# Altium footprint library Altium_Lib.PcbLib: 334 footprints (part 15 of 21)
Each footprint in its own frame and in the unit in brackets; x right, y up, seen from the top. Pads: shape width x height; smd on the part's side, far side on the other; paste and mask are expansions set on the pad; w line width, h text height; cw(c..) or ccw(c..) is an arc to the next point about the centre after c.
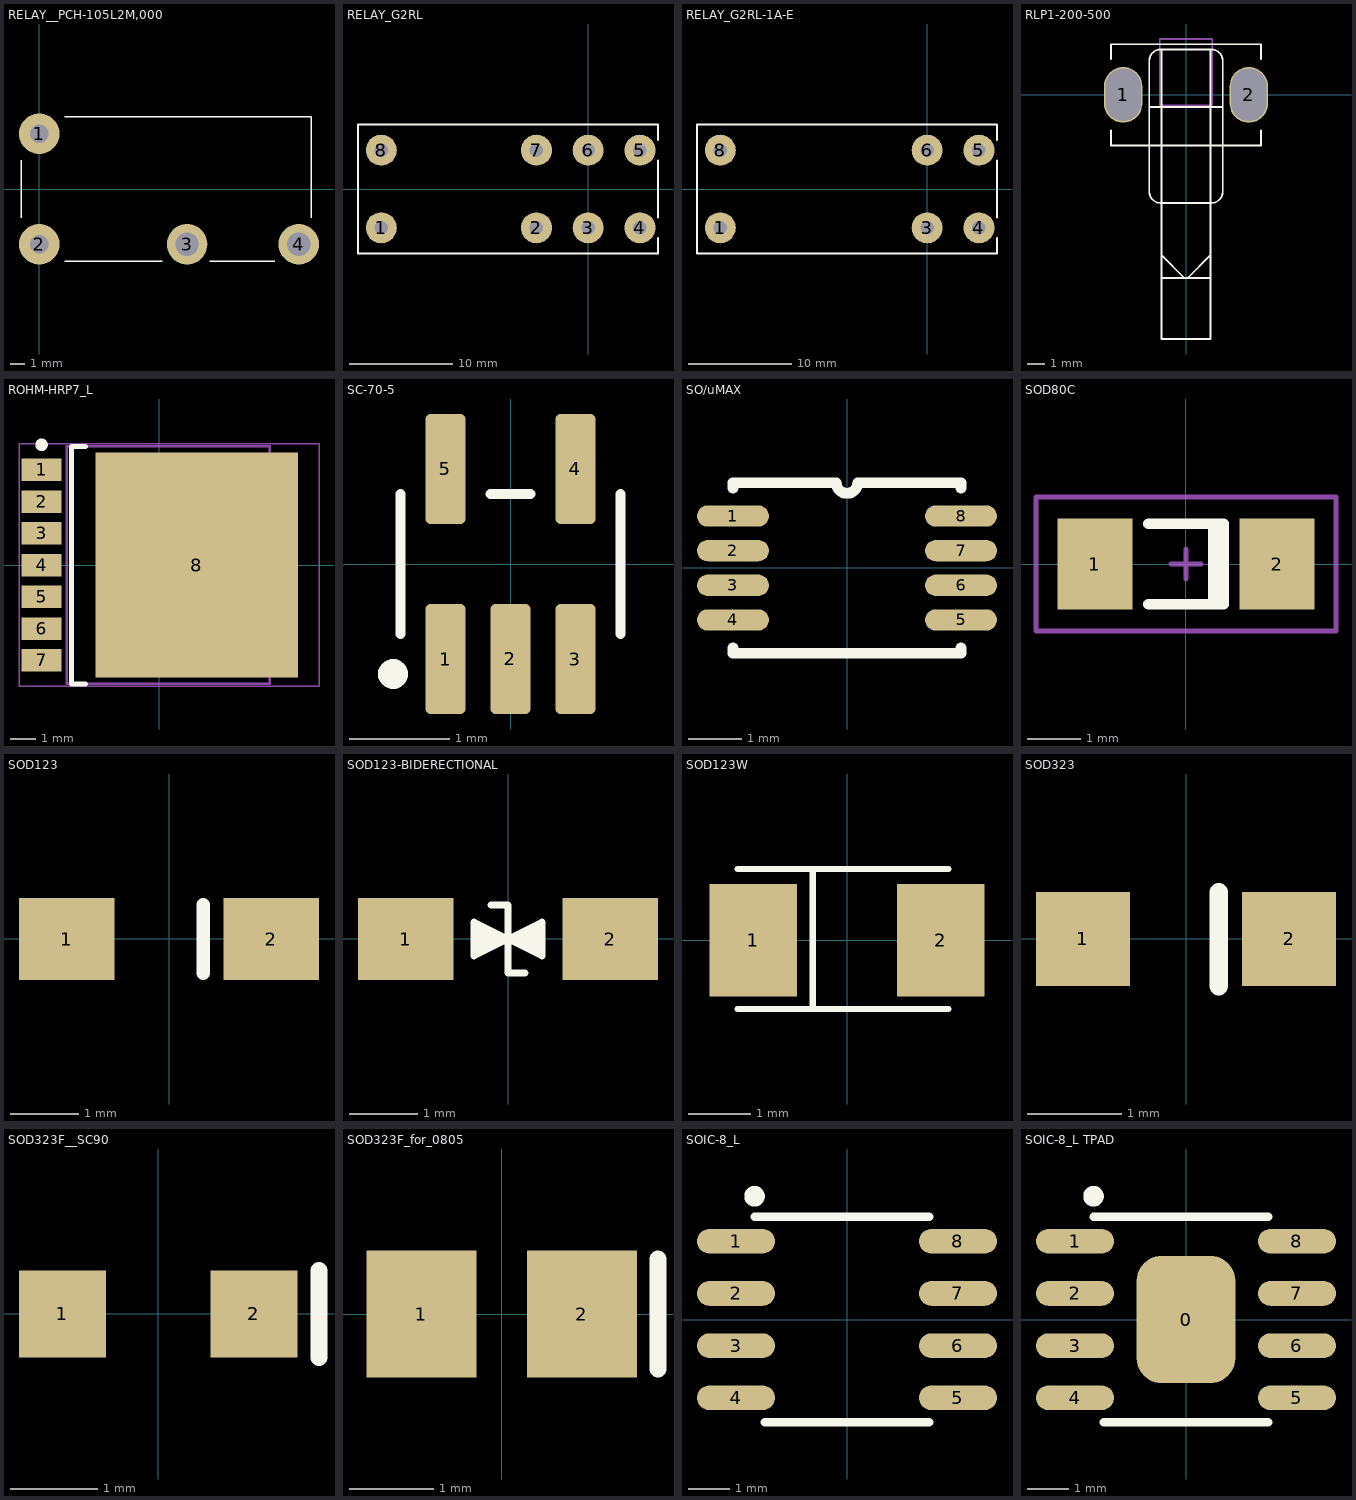
[diagram p14: the footprints below, top view; thin cyan lines are the x and y axes]

## RELAY__PCH-105L2M,000 [mm]
pads (4):
  round 2.8 hole 1.3: 1(0,3.81) 2(0,-3.81)
  round 2.8 hole 1.6: 3(10.2,-3.81) 4(17.9,-3.81)
Top Overlay:
  lines w0.1: -1.25,-2 -1.25,2 ; 1.75,-5 8.5,-5 ; 1.75,5 18.75,5 18.75,-2 ; 11.75,-5 16.25,-5 ; 18.75,-2 18.75,-2
3D body "c-2-1416010-3-a-3d.stp": height 10.65, standoff -3.55, extent -1.25,-5 18.75,5

## RELAY_G2RL [mm]
pads (8):
  round 3 hole 1.3 mask+0.05: 1(-20,-3.75) 2(-5,-3.75) 3(0,-3.75) 4(5,-3.75) 5(5,3.75) 6(0,3.75) 7(-5,3.75) 8(-20,3.75)
Top Overlay:
  lines w0.2: 6.75,-4.75 6.75,-6.25 -22.25,-6.25 -22.25,6.25 6.75,6.25 6.75,4.75 ; 6.75,-2.75 6.75,2.75
3D body "g2rl-2_5dc.stp": height 15.9, standoff -3.3, extent -22.25,-6.35 6.75,6.35

## RELAY_G2RL-1A-E [mm]
pads (6):
  round 3 hole 1.3 mask+0.05: 1(-20,-3.75) 3(0,-3.75) 4(5,-3.75) 5(5,3.75) 6(0,3.75) 8(-20,3.75)
Top Overlay:
  lines w0.2: 6.75,-4.75 6.75,-6.25 -22.25,-6.25 -22.25,6.25 6.75,6.25 6.75,4.75 ; 6.75,-2.75 6.75,2.75
3D body "G2RL_1A_E.step": height 15.7, standoff -3.5, extent -22.25,-6.4 6.75,6.3

## RLP1-200-500 [mm]
pads (2):
  oval 2.2x3.2 hole 2 slot 3 at 90 deg: 1(-3.6,0) 2(3.6,0)
Top Overlay:
  lines w0.1: -4.3,-2.05 -4.3,-2.9 4.3,-2.9 4.3,-2.05 ; -4.3,2.05 -4.3,2.9 4.3,2.9 4.3,2.05 ; -2.1,-0.7 -2.1,-5.565 ccw(c-1.465,-5.565) -1.465,-6.2 1.465,-6.2 ccw(c1.465,-5.565) 2.1,-5.565 2.1,-0.7 ; -2.1,-0.7 -2.1,1.965 cw(c-1.465,1.965) -1.465,2.6 -1.4,2.6 ; -2.1,-0.7 2.1,-0.7 ; -1.4,-10.5 -1.4,-9.2 ; -1.4,-10.5 -1.4,-14 1.4,-14 1.4,-10.5 ; -1.4,-10.5 -0.1,-10.5 ; -1.4,-9.2 -1.4,2.6 ; -1.4,-9.2 -0.1,-10.5 ; -1.4,2.6 1.4,2.6 ; -0.1,-10.5 0.1,-10.5 ; 0.1,-10.5 1.4,-10.5 ; 0.1,-10.5 1.4,-9.2 ; 1.4,-10.5 1.4,-9.2 ; 1.4,-9.2 1.4,2.6 ; 1.4,2.6 1.465,2.6 cw(c1.465,1.965) 2.1,1.965 2.1,-0.7
Mechanical 16:
  lines w0.1: -1.5,-0.6 1.5,-0.6 1.5,3.2 -1.5,3.2 -1.5,-0.6
3D body "RLP1-200-500(part).STEP": height 7.38, standoff -2.71, extent -4.88,-14 4.68,2.9

## ROHM-HRP7_L [mm]
pads (8):
  rect 1.6x0.9 smd: 1(-4.7,3.81) 2(-4.7,2.54) 3(-4.7,1.27) 4(-4.7,0) 5(-4.7,-1.27) 6(-4.7,-2.54) 7(-4.7,-3.81)
  rect 8.1x9 smd: 8(1.5,0)
Top Overlay:
  circle w0.25: c-4.7,4.81 r0.125
  lines w0.2: -2.95,-4.75 -3.5,-4.75 -3.5,4.75 -2.95,4.75
Mechanical 13:
  lines w0.1: -3.7,-4.75 4.43,-4.75 4.43,4.75 -3.7,4.75 -3.7,-4.75
Mechanical 15:
  lines w0.05: -5.6,-4.85 6.397,-4.85 6.397,4.85 -5.6,4.85 -5.6,-4.85
  lines w0.1: -0.5,0 0.5,0 ; 0,-0.5 0,0.5
3D body "DPAK127P1054X201-8L.step": height 2.03, standoff 0, extent -4.193,-4.75 6.347,4.75

## SC-70-5 [mm]
height 1
pads (5):
  rrect25% 0.4x1.1 smd mask+0.051: 1(-0.65,-0.95) 2(0,-0.95) 3(0.65,-0.95) 4(0.65,0.95) 5(-0.65,0.95)
Top Overlay:
  circle w0.15: c-1.175,-1.1 r0.075
  lines w0.1: -1.1,-0.7 -1.1,0.7 ; -0.2,0.7 0.2,0.7 ; 1.1,-0.7 1.1,0.7
3D body "SC70_5.step": height 1.1, standoff 0, extent -1.1,-1.2 1.1,1.2

## SO/uMAX [mm]
height 1.75
pads (8):
  oval 1.35x0.4 smd: 1(-2.14,0.975) 2(-2.14,0.325) 3(-2.14,-0.325) 4(-2.14,-0.975) 5(2.14,-0.975) 6(2.14,-0.325) 7(2.14,0.325) 8(2.14,0.975)
Top Overlay:
  lines w0.2: -2.14,-1.5 -2.14,-1.6 2.14,-1.6 2.14,-1.5 ; -2.14,1.5 -2.14,1.6 -0.2,1.6 ccw(c0,1.6) 0.2,1.6 2.14,1.6 2.14,1.5
3D body "EMSOP-8 Natl Semi MUY08A.STEP": height 1.09, standoff -0.01, extent -2.5,-1.5 2.5,1.5

## SOD80C [mm] "Metal Electrode Face (MELF) Diode; Body 3.5 x 1.6 mm (LxDia)"
height 1.6
pads (2):
  rect 1.4x1.7 smd: 1(-1.7,0) 2(1.7,0)
Top Overlay:
  lines w0.2: -0.7,-0.75 0.7,-0.75 0.7,0.75 -0.7,0.75 ; 0.51,-0.75 0.51,0.75
Mechanical 15:
  lines w0.1: -0.275,0 0.275,0 ; 0,-0.275 0,0.275 ; -2.8,-1.25 -2.8,1.25 2.8,1.25 2.8,-1.25 -2.8,-1.25
3D body "SOD80C.STEP": height 1.5, standoff 0, extent -1.75,-0.75 1.75,0.75

## SOD123 [mm]
pads (2):
  rect 1.4x1.2 smd: 1(-1.5,0) 2(1.5,0)
Top Overlay:
  lines w0.2: 0.5,-0.5 0.5,0.5
3D body "SOD_123.step": height 1.44, standoff -0.01, extent -1.925,-0.85 1.925,0.85

## SOD123-BIDERECTIONAL [mm]
pads (2):
  rect 1.4x1.2 smd: 1(-1.5,0) 2(1.5,0)
Top Overlay:
  region: -0.5,0.25 -0.5,-0.25 0,0
  region: 0,0 0.5,0.25 0.5,-0.25
  lines w0.1: -0.25,0.5 0,0.5 0,-0.5 0.25,-0.5 ; 0,0 0.5,0.25 0.5,-0.25 0,0 ; 0,0 -0.5,-0.25 -0.5,0.25 0,0
3D body "SW3dPS-sod-123-270x160h115.STEP": height 1.15, standoff 0, extent -1.85,-0.8 1.85,0.8

## SOD123W [mm]
pads (2):
  rect 1.4x1.8 smd: 1(-1.5,0) 2(1.5,0)
Top Overlay:
  lines w0.1: -1.75,-1.1 1.62,-1.1 ; -1.75,1.14 1.62,1.14 ; -0.55,-1.1 -0.55,1.14
3D body "SOD_123W.step": height 1.1, standoff -0.01, extent -1.95,-0.98 2.05,0.92

## SOD323 [mm]
pads (2):
  rect 1x1 smd: 1(-1.1,0) 2(1.1,0)
Top Overlay:
  lines w0.2: 0.35,-0.5 0.35,0.5
3D body "SOD323__SC76.step": height 0.98, standoff -0.01, extent -1.25,-0.625 1.25,0.625

## SOD323F__SC90 [mm]
pads (2):
  rect 1x1 smd: 1(-1.1,0) 2(1.1,0)
Top Overlay:
  lines w0.2: 1.85,-0.5 1.85,0.5
3D body "SOD323F__SC90.step": height 0.83, standoff 0.07, extent -1.4,-0.675 1.4,0.675

## SOD323F_for_0805 [mm]
pads (2):
  rect 1.3x1.5 smd: 1(-0.95,0) 2(0.95,0)
Top Overlay:
  lines w0.2: 1.85,-0.65 1.85,0.65
3D body "SOD323F__SC90.step": height 0.83, standoff 0.07, extent -1.4,-0.675 1.4,0.675

## SOIC-8_L [mm] "SOIC, 8-Leads, Body 4.9x3.9mm, Pitch 1.27mm, IPC High Density"
height 1.75
pads (8):
  oval 1.9x0.6 smd: 1(-2.7,1.905) 2(-2.7,0.635) 3(-2.7,-0.635) 4(-2.7,-1.905) 5(2.7,-1.905) 6(2.7,-0.635) 7(2.7,0.635) 8(2.7,1.905)
Top Overlay:
  circle w0.25: c-2.25,3 r0.125
  lines w0.2: -2.25,2.5 2,2.5 ; -2,-2.5 2,-2.5
3D body "SOIC_8.STEP": height 1.75, standoff 0, extent -3.006,-2.5 3.006,2.5

## SOIC-8_L TPAD [mm] "SOIC, 8-Leads, Body 4.9x3.9mm, Pitch 1.27mm, IPC High Density"
height 1.75
pads (9):
  rrect50% 2.4x3.1 smd: 0(0,0)
  oval 1.9x0.6 smd: 1(-2.7,1.905) 2(-2.7,0.635) 3(-2.7,-0.635) 4(-2.7,-1.905) 5(2.7,-1.905) 6(2.7,-0.635) 7(2.7,0.635) 8(2.7,1.905)
Top Overlay:
  circle w0.25: c-2.25,3 r0.125
  lines w0.2: -2.25,2.5 2,2.5 ; -2,-2.5 2,-2.5
3D body "SOIC_8.STEP": height 1.75, standoff 0, extent -3.006,-2.5 3.006,2.5